# Altium footprint library Altium_Lib.PcbLib: 334 footprints (part 9 of 21)
Each footprint in its own frame and in the unit in brackets; x right, y up, seen from the top. Pads: shape width x height; smd on the part's side, far side on the other; paste and mask are expansions set on the pad; w line width, h text height; cw(c..) or ccw(c..) is an arc to the next point about the centre after c.
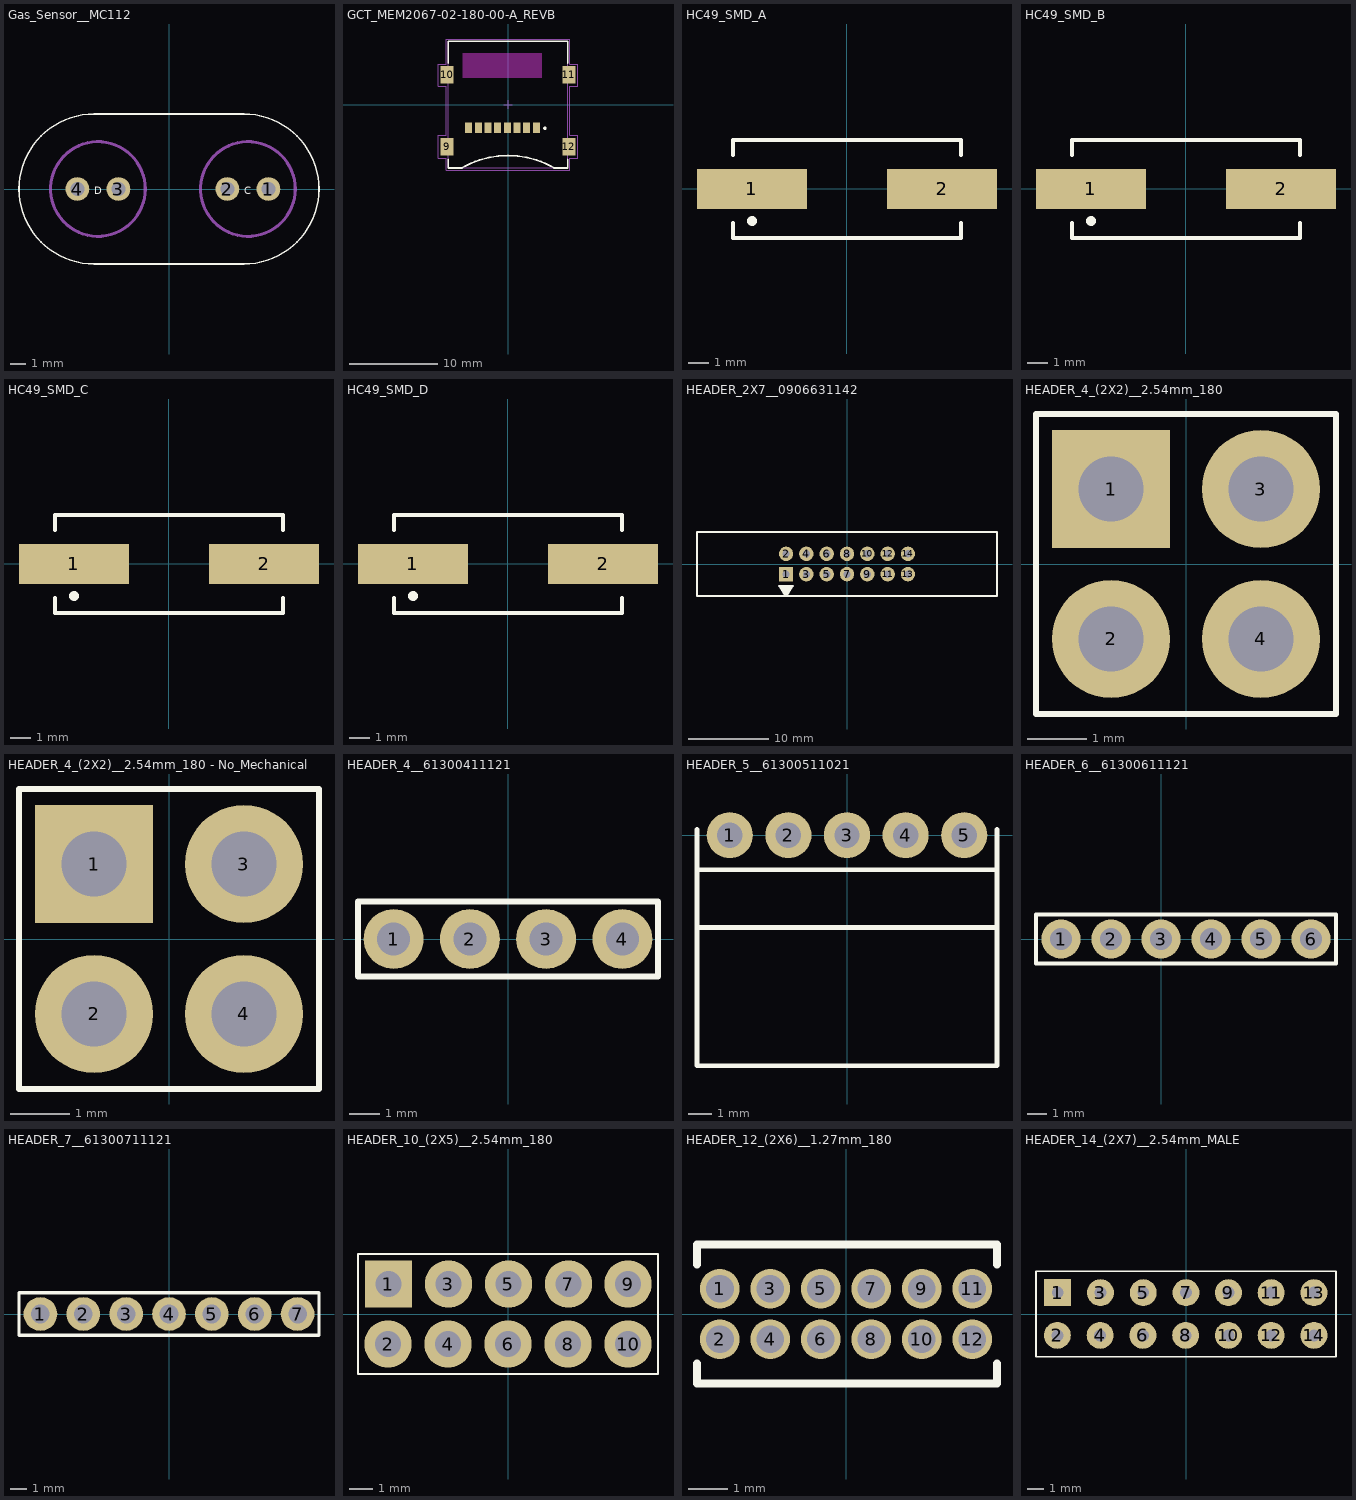
[diagram p8: the footprints below, top view; thin cyan lines are the x and y axes]

## Gas_Sensor__MC112 [mm]
height 14
pads (4):
  round 1.5 hole 0.9 unplated: 1(6.3,0) 2(3.7,0) 3(-3.2,0) 4(-5.8,0)
Top Overlay:
  lines w0.1: -4.75,-4.75 cw(c-4.75,0) -4.75,4.75 4.75,4.75 cw(c4.75,0) 4.75,-4.75 -4.75,-4.75
  text "D" at -4.75,-0.5 h0.8
  text "C" at 4.75,-0.5 h0.8
Mechanical 15:
  circle w0.2: c5,0 r3
  circle w0.2: c-4.5,0 r3
  circle w0.2: c6.3,0 r0.32
  circle w0.2: c3.7,0 r0.32
  circle w0.2: c-3.2,0 r0.32
  circle w0.2: c-5.8,0 r0.32
3D body: height 14.3, standoff 0, extent 2.001,-2.999 7.999,2.999
3D body: height 14.3, standoff 0, extent -7.499,-2.999 -1.501,2.999
3D body: height 16, standoff 0, extent 5.98,-0.32 6.62,0.32
3D body: height 16, standoff 0, extent 3.381,-0.319 4.019,0.319
3D body: height 16, standoff 0, extent -3.52,-0.32 -2.88,0.32
3D body: height 16, standoff 0, extent -6.119,-0.319 -5.481,0.319
3D body: height 14, standoff 0, extent -9.501,-4.751 9.501,4.751

## GCT_MEM2067-02-180-00-A_REVB [mm]
pads (12):
  rect 0.8x1.2 smd: 1(3.225,-2.625) 2(2.125,-2.625) 3(1.025,-2.625) 4(-0.075,-2.625) 5(-1.175,-2.625) 6(-2.275,-2.625) 7(-3.375,-2.625) 8(-4.475,-2.625)
  rect 1.5x2 smd: 9(-6.945,-4.825) 10(-6.945,3.375) 11(6.945,3.375) 12(6.945,-4.825)
Top Overlay:
  circle w0.2: c4.2,-2.7 r0.1
  lines w0.2: -6.8,-6.275 -6.8,-7.225 -5.25,-7.225 ; -6.8,4.725 -6.8,7.225 6.8,7.225 6.8,4.725 ; -5.226,-7.211 cw(c0,-16.264) 5.226,-7.211 ; 5.25,-7.225 6.8,-7.225 6.8,-6.275
Keep-Out Layer:
  region: 3.85,3.028 -5.155,3.028 -5.155,5.825 3.85,5.825
Mechanical 13:
  lines w0.1: -6.8,2.77 -7.3,2.77 -7.3,3.97 -6.8,3.97 ; -0.5,0 0.5,0 ; 0,-0.5 0,0.5 ; -6.8,-5.4 -6.8,-7.225 6.8,-7.225 6.8,-5.4 ; -6.8,-5.4 -6.8,-4.2 ; -6.8,-5.4 -7.3,-5.4 -7.3,-4.2 -6.8,-4.2 ; -6.8,-4.2 -6.8,7.225 6.8,7.225 6.8,3.97 ; 6.8,-5.4 7.3,-5.4 7.3,-4.2 6.8,-4.2 ; 6.8,-5.4 6.8,-4.2 ; 6.8,-4.2 6.8,2.77 ; 6.8,2.77 7.3,2.77 7.3,3.97 6.8,3.97 ; 6.8,2.77 6.8,3.97
Mechanical 15:
  lines w0.05: -7.95,-6.096 -7.95,-3.505 -7.061,-3.505 -7.061,2.108 -7.95,2.108 -7.95,4.597 -7.061,4.597 -7.061,7.468 7.061,7.468 7.061,4.597 7.95,4.597 7.95,2.108 7.061,2.108 7.061,-3.505 7.95,-3.505 7.95,-6.096 7.061,-6.096 7.061,-7.468 -7.061,-7.468 -7.061,-6.096 -7.95,-6.096
3D body "MEM2067-02-180-00-A--3DModel-STEP-56544.STEP": height 1.8, standoff 0, extent -7.3,-7.225 7.3,7.225

## HC49_SMD_A [mm]
height 4.3
pads (2):
  rect 5.5x2 smd: 1(-4.75,0) 2(4.75,0)
Top Overlay:
  circle w0.25: c-4.75,-1.6 r0.125
  lines w0.2: -5.7,-1.7 -5.7,-2.45 5.7,-2.45 5.7,-1.7 ; -5.7,1.7 -5.7,2.45 5.7,2.45 5.7,1.7
3D body "HC49_SMD_A.step": height 5.18, standoff 0, extent -6.15,-2.25 6.15,2.25

## HC49_SMD_B [mm]
height 4.3
pads (2):
  rect 5.5x2 smd: 1(-4.75,0) 2(4.75,0)
Top Overlay:
  circle w0.25: c-4.75,-1.6 r0.125
  lines w0.2: -5.7,-1.7 -5.7,-2.45 5.7,-2.45 5.7,-1.7 ; -5.7,1.7 -5.7,2.45 5.7,2.45 5.7,1.7
3D body "HC49_SMD_B.step": height 4.3, standoff 0, extent -6.15,-2.25 6.15,2.25

## HC49_SMD_C [mm]
height 4.3
pads (2):
  rect 5.5x2 smd: 1(-4.75,0) 2(4.75,0)
Top Overlay:
  circle w0.25: c-4.75,-1.6 r0.125
  lines w0.2: -5.7,-1.7 -5.7,-2.45 5.7,-2.45 5.7,-1.7 ; -5.7,1.7 -5.7,2.45 5.7,2.45 5.7,1.7
3D body "HC49_SMD_C.step": height 3.6, standoff 0, extent -6.15,-2.25 6.15,2.25

## HC49_SMD_D [mm]
height 4.3
pads (2):
  rect 5.5x2 smd: 1(-4.75,0) 2(4.75,0)
Top Overlay:
  circle w0.25: c-4.75,-1.6 r0.125
  lines w0.2: -5.7,-1.7 -5.7,-2.45 5.7,-2.45 5.7,-1.7 ; -5.7,1.7 -5.7,2.45 5.7,2.45 5.7,1.7
3D body "HC49_SMD_D.step": height 2.6, standoff 0, extent -6.15,-2.25 6.15,2.25

## HEADER_2X7__0906631142 [mm]
pads (14):
  rect 1.8x1.8 hole 0.9: 1(-7.62,-1.27)
  round 1.8 hole 0.9: 2(-7.62,1.27) 3(-5.08,-1.27) 4(-5.08,1.27) 5(-2.54,-1.27) 6(-2.54,1.27) 7(0,-1.27) 8(0,1.27) 9(2.54,-1.27) 10(2.54,1.27) 11(5.08,-1.27) 12(5.08,1.27) 13(7.62,-1.27) 14(7.62,1.27)
Top Overlay:
  region: -6.75,-2.75 -7.5,-4 -7.75,-4 -8.5,-2.75
  lines w0.2: -7.75,-4 -8.5,-2.75 -6.75,-2.75 -7.5,-4 ; -18.75,-4 -18.75,4 18.75,4 18.75,-4 -18.75,-4
3D body "906631142.stp": height 27.3, standoff -2.8, extent -18.62,-4.1 18.62,4.4

## HEADER_4_(2X2)__2.54mm_180 [mm]
pads (4):
  rect 2x2 hole 1.1: 1(-1.27,1.27)
  round 2 hole 1.1: 2(-1.27,-1.27) 3(1.27,1.27) 4(1.27,-1.27)
Top Overlay:
  lines w0.1: -2.54,-2.54 2.54,-2.54 2.54,2.54 -2.54,2.54 -2.54,-2.54
3D body "4 Pin Gold 11,56 Kinked C-Grid 70280.STEP": height 8.4, standoff -3.17, extent -2.54,-2.54 2.54,2.54

## HEADER_4_(2X2)__2.54mm_180 - No_Mechanical [mm]
pads (4):
  rect 2x2 hole 1.1: 1(-1.27,1.27)
  round 2 hole 1.1: 2(-1.27,-1.27) 3(1.27,1.27) 4(1.27,-1.27)
Top Overlay:
  lines w0.1: -2.54,-2.54 2.54,-2.54 2.54,2.54 -2.54,2.54 -2.54,-2.54

## HEADER_4__61300411121 [mm]
pads (4):
  round 2 hole 1.1: 1(-3.81,0) 2(-1.27,0) 3(1.27,0) 4(3.81,0)
Top Overlay:
  lines w0.2: -5,-1.25 5,-1.25 5,1.25 -5,1.25 -5,-1.25
3D body "STEP-61300411121-rev1.stp": height 8.67, standoff -2.87, extent -5.08,-1.25 5.08,1.29

## HEADER_5__61300511021 [mm]
pads (5):
  round 2 hole 1.1: 1(-5.08,0) 2(-2.54,0) 3(0,0) 4(2.54,0) 5(5.08,0)
Top Overlay:
  lines w0.2: -6.5,-4 6.5,-4 ; -6.5,-1.5 6.5,-1.5 ; -6.5,0.25 -6.5,-10 6.5,-10 6.5,0.25
3D body "STEP-61300511021-rev1.stp": height 2.77, standoff -2.77, extent -6.35,-10.02 6.35,0.34

## HEADER_6__61300611121 [mm]
pads (6):
  round 2 hole 1.1: 1(-5.08,0) 2(-2.54,0) 3(0,0) 4(2.54,0) 5(5.08,0) 6(7.62,0)
Top Overlay:
  lines w0.2: -6.35,-1.25 -6.35,1.25 8.89,1.25 8.89,-1.25 -6.35,-1.25
3D body "Download_STP_61300611121 (rev1).stp": height 8.67, standoff -2.87, extent -6.35,-1.27 8.89,1.27

## HEADER_7__61300711121 [mm]
pads (7):
  round 2 hole 1.1: 1(-7.62,0) 2(-5.08,0) 3(-2.54,0) 4(0,0) 5(2.54,0) 6(5.08,0) 7(7.62,0)
Top Overlay:
  lines w0.2: -8.89,-1.25 -8.89,1.25 8.89,1.25 8.89,-1.25 -8.89,-1.25
3D body "61300711121 (rev1).stp": height 8.67, standoff -2.87, extent -8.89,-1.27 8.89,1.27

## HEADER_10_(2X5)__2.54mm_180 [mm]
pads (10):
  rect 2x2 hole 1.1: 1(-5.06,1.27)
  round 2 hole 1.1: 2(-5.08,-1.27) 3(-2.52,1.27) 4(-2.54,-1.27) 5(0.02,1.27) 6(0,-1.27) 7(2.56,1.27) 8(2.54,-1.27) 9(5.08,1.27) 10(5.08,-1.27)
Top Overlay:
  lines w0.1: -6.35,-2.54 6.35,-2.54 6.35,2.54 -6.35,2.54 -6.35,-2.54
3D body "010897100.stp": height 8.44, standoff -2.66, extent -6.35,-2.489 6.35,2.591

## HEADER_12_(2X6)__1.27mm_180 [mm]
pads (12):
  round 1 hole 0.7: 1(-3.175,0.635) 2(-3.175,-0.635) 3(-1.905,0.635) 4(-1.905,-0.635) 5(-0.635,0.635) 6(-0.635,-0.635) 7(0.635,0.635) 8(0.635,-0.635) 9(1.905,0.635) 10(1.905,-0.635) 11(3.175,0.635) 12(3.175,-0.635)
Top Overlay:
  lines w0.2: -3.75,-1.25 -3.75,-1.75 3.8,-1.75 3.8,-1.25 ; -3.75,1.25 -3.75,1.75 3.8,1.75 3.8,1.25
3D body "20021111-00012XXLFc.stp": height 5.5, standoff -2.35, extent -3.81,-1.7 3.81,1.7

## HEADER_14_(2X7)__2.54mm_MALE [mm]
pads (14):
  rect 1.6x1.6 hole 0.7: 1(-7.62,1.27)
  round 1.6 hole 0.7: 2(-7.64,-1.27) 3(-5.08,1.27) 4(-5.1,-1.27) 5(-2.54,1.27) 6(-2.56,-1.27) 7(0,1.27) 8(-0.02,-1.27) 9(2.52,1.27) 10(2.52,-1.27) 11(5.06,1.27) 12(5.06,-1.27) 13(7.6,1.27) 14(7.6,-1.27)
Top Overlay:
  lines w0.1: -8.91,-2.54 -8.91,2.54 8.91,2.54 8.91,-2.54 -8.91,-2.54
3D body "mill-max-800-10-014-10-002000.STEP": height 6.27, standoff -3.51, extent -8.89,-2.5 8.89,2.58